# Altium footprint library LHAC-4XDSP2XV7-VP5_0226_3.PcbLib: 96 footprints (part 12 of 12)
Each footprint in its own frame and in the unit in brackets; x right, y up, seen from the top. Pads: shape width x height; smd on the part's side, far side on the other; paste and mask are expansions set on the pad; w line width, h text height; cw(c..) or ccw(c..) is an arc to the next point about the centre after c.
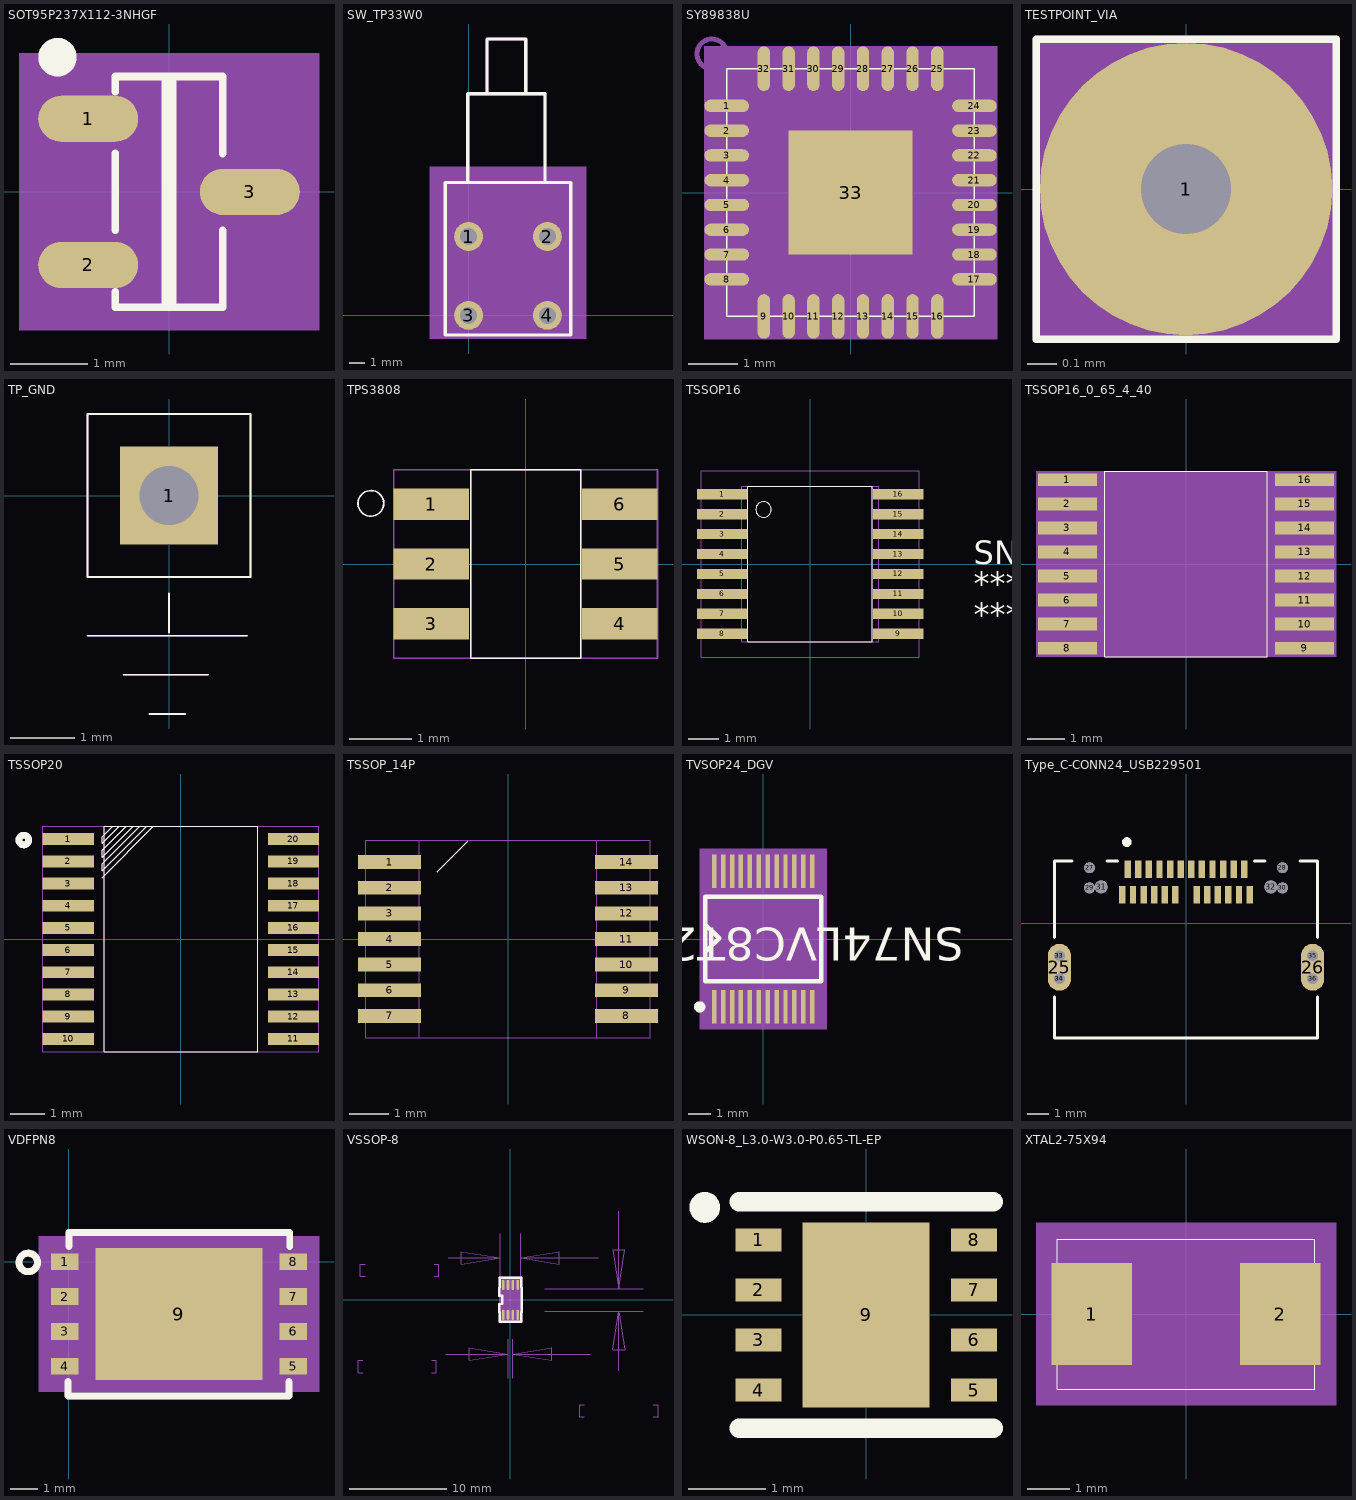
[diagram p11: the footprints below, top view; thin cyan lines are the x and y axes]

## SOT95P237X112-3NHGF [mil] "SOT95P237X112-3NHGF"
pads (3):
  oval 51.18x23.62 smd: 1(-41.34,37.4) 2(-41.34,-37.4) 3(41.34,0)
Top Overlay:
  circle w9.84: c-57.09,68.9 r4.92
  lines w3.94: -27.56,-51.18 -27.56,-59.06 27.56,-59.06 27.56,-19.69 ; -27.56,-19.69 -27.56,19.69 ; -27.56,51.18 -27.56,59.06 27.56,59.06 27.56,19.69
  lines w7.87: 0,-57.09 0,57.09
  text ".Designator" at 90,0 h25
Mechanical 5:
  circle w9.84: c-57.09,68.9 r4.92
  lines w3.94: -27.56,-51.18 -27.56,-59.06 27.56,-59.06 27.56,-19.69 ; -27.56,-19.69 -27.56,19.69 ; -27.56,51.18 -27.56,59.06 27.56,59.06 27.56,19.69
  lines w7.87: 0,-57.09 0,57.09
  text "Q3" at 89.99,0 h25
  text "L14P2/TO_0_SOT95P237X112-3NHGF_" at -310,29.53 h25
Mechanical 14:
  text "2" at -51.34,-37.4 h25
  text "1" at -51.34,37.4 h25
  text "3" at 31.34,0 h25
Mechanical 16:
  circle w1.97: c0,0 r13.78
  region: -76.77,-70.87 -76.77,70.87 76.77,70.87 76.77,-70.87
  pour cut-out: -76.77,-70.87 -76.77,70.87 76.77,70.87 76.77,-70.87
  lines w1.97: -19.69,0 19.69,0 ; 0,-19.69 0,19.69
  lines w3.94: -25.59,18.11 13.78,57.48 ; -25.59,22.05 9.84,57.48 ; -25.59,25.98 5.91,57.48 ; -25.59,29.92 1.97,57.48 ; -25.59,33.86 -1.97,57.48 ; -25.59,37.8 -5.91,57.48 ; -25.59,41.73 -9.84,57.48 ; -25.59,45.67 -13.78,57.48 ; -25.59,49.61 -17.72,57.48 ; -25.59,53.54 -21.65,57.48 ; -25.59,-57.48 25.59,-57.48 25.59,57.48 -25.59,57.48 -25.59,-57.48
3D body: height 150, standoff 0, extent -76.77,-70.87 76.77,70.87

## SW_TP33W0 [mil] "SW_TP33W0"
pads (4):
  round 73 hole 43: 1(0,200) 2(200,200) 3(0,0) 4(200,0)
Top Overlay:
  lines w8: -2,337 -2,562 194,562 194,337 ; 47,562 47,701 145,701 145,562 ; -59,-50 -59,337 259,337 259,-50 -59,-50
Mechanical 5:
  lines w8: -2,337 -2,562 194,562 194,337 ; 47,562 47,701 145,701 145,562 ; -59,-50 259,-50 259,337 -59,337 -59,-50
  text "SW1" at 280.05,132.35 h25
Mechanical 14:
  text "4" at 200,10 h25
  text "3" at 0,10 h25
  text "2" at 200,210 h25
  text "1" at 0,210 h25
Mechanical 16:
  region: -99,-60 299,-60 299,377 -99,377
  lines w1: -59,0 -59,337 259,337 259,0 -59,0 ; -2,337 -2,562 194,562 194,337 -2,337 ; 47,562 47,701 145,701 145,562 47,562
Mechanical 17:
  text ".Designator" at 59.84,148.13 h31.1
  text "TP33W003050" at -55,-100 h31.1
3D body: height 150, standoff 0, extent -99,-60 299,377

## SY89838U [mil] "SY89838U"
pads (33):
  oval 35.43x9.84 smd: 1(-98.42,68.9) 2(-98.42,49.21) 3(-98.42,29.53) 4(-98.42,9.84) 5(-98.42,-9.84) 6(-98.42,-29.53) 7(-98.42,-49.21) 8(-98.42,-68.9) 17(98.42,-68.9) 18(98.42,-49.21) 19(98.42,-29.53) 20(98.42,-9.84) 21(98.42,9.84) 22(98.42,29.53) 23(98.42,49.21) 24(98.42,68.9)
  oval 9.84x35.43 smd: 9(-68.9,-98.42) 10(-49.21,-98.42) 11(-29.53,-98.42) 12(-9.84,-98.42) 13(9.84,-98.42) 14(29.53,-98.42) 15(49.21,-98.42) 16(68.9,-98.42) 25(68.9,98.42) 26(49.21,98.42) 27(29.53,98.42) 28(9.84,98.42) 29(-9.84,98.42) 30(-29.53,98.42) 31(-49.21,98.42) 32(-68.9,98.42)
  rect 98.42x98.42 smd: 33(0,0)
Top Overlay:
  lines w1: -98.42,-98.42 98.42,-98.42 98.42,98.42 -98.42,98.42 -98.42,-98.42
Mechanical 5:
  lines w1: -98.42,-73.82 -98.42,-98.42 -73.82,-98.42 ; -98.42,-63.98 -98.42,-54.12 ; -98.42,-44.3 -98.42,-34.44 ; -98.42,-24.62 -98.42,-14.76 ; -98.42,-4.92 -98.42,4.92 ; -98.42,14.76 -98.42,24.62 ; -98.42,34.44 -98.42,44.3 ; -98.42,54.12 -98.42,63.98 ; -98.42,73.82 -98.42,98.42 -73.82,98.42 ; -63.98,-98.42 -54.12,-98.42 ; -63.98,98.42 -54.12,98.42 ; -44.3,-98.42 -34.44,-98.42 ; -44.3,98.42 -34.44,98.42 ; -24.62,-98.42 -14.76,-98.42 ; -24.62,98.42 -14.76,98.42 ; -4.92,-98.42 4.92,-98.42 ; -4.92,98.42 4.92,98.42 ; 14.76,-98.42 24.62,-98.42 ; 14.76,98.42 24.62,98.42 ; 34.44,-98.42 44.3,-98.42 ; 34.44,98.42 44.3,98.42 ; 54.12,-98.42 63.98,-98.42 ; 54.12,98.42 63.98,98.42 ; 73.82,-98.42 98.42,-98.42 98.42,-73.82 ; 73.82,98.42 98.42,98.42 98.42,73.82 ; 98.42,-63.98 98.42,-54.12 ; 98.42,-44.3 98.42,-34.44 ; 98.42,-24.62 98.42,-14.76 ; 98.42,-4.92 98.42,4.92 ; 98.42,14.76 98.42,24.62 ; 98.42,34.44 98.42,44.3 ; 98.42,54.12 98.42,63.98
  text "U73" at -7.49,-122.5 h25
Mechanical 14:
  text "23" at 114.42,49.21 h20
  text "24" at 114.42,68.9 h20
  text "16" at 84.9,-98.42 h20
  text "15" at 65.21,-98.42 h20
  text "6" at -90.42,-29.53 h20
  text "8" at -90.42,-68.9 h20
  text "4" at -90.42,9.84 h20
  text "5" at -90.42,-9.84 h20
  text "2" at -90.42,49.21 h20
  text "7" at -90.42,-49.21 h20
  text "14" at 45.53,-98.42 h20
  text "11" at -13.53,-98.42 h20
  text "12" at 6.16,-98.42 h20
  text "13" at 25.84,-98.42 h20
  text "3" at -90.42,29.53 h20
  text "1" at -90.42,68.9 h20
  text "26" at 65.21,98.42 h20
  text "31" at -33.21,98.42 h20
  text "25" at 84.9,98.42 h20
  text "10" at -33.21,-98.42 h20
  text "18" at 114.42,-49.21 h20
  text "17" at 114.42,-68.9 h20
  text "22" at 114.42,29.53 h20
  text "19" at 114.42,-29.53 h20
  text "32" at -52.9,98.42 h20
  text "9" at -60.9,-98.42 h20
  text "29" at 6.16,98.42 h20
  text "30" at -13.53,98.42 h20
  text "27" at 45.53,98.42 h20
  text "28" at 25.84,98.42 h20
  text "21" at 114.42,9.84 h20
  text "20" at 114.42,-9.84 h20
  text "33" at 32,0 h20
Mechanical 16:
  circle w3.94: c-110.24,110.24 r11.81
  pour cut-out: -116.34,-116.34 116.34,-116.34 116.34,116.34 -116.34,116.34
  region: -116.34,-116.34 116.34,-116.34 116.34,116.34 -116.34,116.34
  lines w1: -98.42,-98.42 98.42,-98.42 98.42,98.42 -98.42,98.42 -98.42,-98.42
Mechanical 17:
  text ".Designator" at 60.01,-16.67 h50
3D body: height 150, standoff 0, extent -116.34,-116.34 116.34,116.34

## TESTPOINT_VIA [mil] "TESTPOINT_VIA"
pads (1):
  round 39 / inner round 20 / far side round 39 hole 12: 1(0,0)
Top Overlay:
  lines w1: -20,-20 -20,20 20,20 20,-20 -20,-20
Mechanical 5:
  lines w1: -20,-20 -20,20 20,20 20,-20 -20,-20
  text "TP38" at -117.19,97.15 h25
Mechanical 14:
  text "1" at 0,8 h20
Mechanical 16:
  region: -20,-20 20,-20 20,20 -20,20
  pour cut-out: -20,-20 20,-20 20,20 -20,20
  lines w1: -20,-20 -20,20 20,20 20,-20 -20,-20
Mechanical 17:
  text ".Designator" at 0,40 h25
3D body: height 150, standoff 0, extent -20,-20 20,20

## TP_GND [mil] "TP_GND"
pads (1):
  rect 60x60 / inner rect 55x55 / far side rect 60x60 hole 36: 1(0,0)
Top Overlay:
  lines w1: -50,-86 48,-86 ; -28,-110 24,-110 ; -12,-134 10,-134 ; 0,-84 0,-60 ; -50,-50 -50,50 50,50 50,-50 -50,-50
  text ".Designator" at -45.01,57.5 h25
Bottom Overlay:
  lines w1: -50,-86 48,-86 ; -28,-110 24,-110 ; -12,-134 10,-134 ; 0,-84 0,-60 ; -50,-50 -50,50 50,50 50,-50 -50,-50
Mechanical 5:
  lines w1: -50,-86 48,-86 ; -28,-110 24,-110 ; -12,-134 10,-134 ; 0,-84 0,-60 ; -50,-50 -50,50 50,50 50,-50 -50,-50
  text "TP29" at -45.01,57.5 h25
Mechanical 14:
  text "1" at -4,0 h10
Mechanical 16:
  lines w1: -50,-50 -50,50 ; -50,-50 50,-50 ; -50,-50 -50,50 ; -50,-50 50,-50 ; -50,50 50,50 ; -50,50 50,50 ; 50,-50 50,50 ; 50,-50 50,50

## TPS3808 [mil] "TPS3808"
pads (6):
  rect 47.24x19.68 smd: 1(-59.06,37.4) 2(-59.06,0) 3(-59.06,-37.4) 4(59.06,-37.4) 5(59.06,0) 6(59.06,37.4)
Top Overlay:
  circle w1: c-97,38 r8.06
  lines w1: -34.45,-59.06 34.45,-59.06 34.45,59.06 -34.45,59.06 -34.45,-59.06
  text ".Designator" at -56.89,67.61 h25
Top Paste:
  pour cut-out: -83.03,46.53 -83.03,27.53 -36.03,27.53 -36.03,46.53
  pour cut-out: -83.03,9.53 -83.03,-9.47 -36.03,-9.47 -36.03,9.53
  pour cut-out: -82.03,-28.47 -82.03,-47.47 -35.03,-47.47 -35.03,-28.47
  pour cut-out: 34.97,-27.47 34.97,-46.47 81.97,-46.47 81.97,-27.47
  pour cut-out: 35.97,9.53 35.97,-9.47 82.97,-9.47 82.97,9.53
  pour cut-out: 35.97,46.53 35.97,27.53 82.97,27.53 82.97,46.53
Top Solder:
  pour cut-out: -83,47 -83,28 -36,28 -36,47
  pour cut-out: -83,10 -83,-10 -35,-10 -35,10
  pour cut-out: -83,-27 -83,-48 -35,-48 -35,-27
  pour cut-out: 35,-28 35,-47 83,-47 83,-28
  pour cut-out: 35,10 35,-10 83,-10 83,10
  pour cut-out: 35,47 35,28 83,28 83,47
Mechanical 5:
  lines w1: -105.06,38 ccw(c-97,38) -97,29.94 ccw(c-97,38) -88.94,38 ccw(c-97,38) -97,46.06 ccw(c-97,38) -105.06,38 ; -34.45,-59.06 34.45,-59.06 34.45,59.06 -34.45,59.06 -34.45,-59.06
  text "U112" at 54.78,160.95 h25
Mechanical 14:
  text "1" at -67.06,37.4 h20
  text "6" at 51.06,37.4 h20
  text "4" at 51.06,-37.4 h20
  text "3" at -67.06,-37.4 h20
  text "5" at 51.06,0 h20
  text "2" at -67.06,0 h20
Mechanical 16:
  lines w1: -82.68,-59.06 82.68,-59.06 ; -82.68,-59.06 -82.68,59.06 ; -82.68,-59.06 82.68,-59.06 ; -82.68,-59.06 -82.68,59.06 ; -82.68,59.06 82.68,59.06 ; -82.68,59.06 82.68,59.06 ; 82.68,-59.06 82.68,59.06 ; 82.68,-59.06 82.68,59.06 ; -34.45,-59.06 34.45,-59.06 34.45,59.06 -34.45,59.06 -34.45,-59.06

## TSSOP16 [mil] "TSSOP16"
pads (16):
  rect 65x13 smd: 1(-113,89.6) 2(-113,64) 3(-113,38.4) 4(-113,12.8) 5(-113,-12.8) 6(-113,-38.4) 7(-113,-64) 8(-113,-89.6) 9(113,-89.6) 10(113,-64) 11(113,-38.4) 12(113,-12.8) 13(113,12.8) 14(113,38.4) 15(113,64) 16(113,89.6)
Top Overlay:
  circle w1: c-60,70 r10
  lines w1: -80,-100 -80,100 80,100 80,-100 -80,-100
  text "SN74AVC4T245PW" at 210,0 h30
  text "***" at 210,-40 h30
  text "***" at 210,-80 h30
Mechanical 5:
  circle w1: c-60,70 r10
  lines w1: -80,-100 -80,100 80,100 80,-100 -80,-100
  text "***" at 245,-80 h30
  text "***" at 245,-5 h30
  text "SN74AVC4T245PW" at 210,0 h30
  text "141_TI_SN74AVC4T245PWR_2_TSSOP1" at 210,40 h30
  text "U57" at -22.51,117.5 h25
Mechanical 14:
  text "9" at 113,-89.6 h25
  text "15" at 113,64 h25
  text "14" at 113,38.4 h25
  text "8" at -133,-89.6 h25
  text "1" at -133,89.6 h25
  text "3" at -133,38.4 h25
  text "2" at -133,64 h25
  text "4" at -133,12.8 h25
  text "11" at 113,-38.4 h25
  text "5" at -133,-12.8 h25
  text "7" at -133,-64 h25
  text "6" at -133,-38.4 h25
  text "13" at 113,12.8 h25
  text "10" at 113,-64 h25
  text "12" at 113,-12.8 h25
  text "16" at 113,89.6 h25
Mechanical 16:
  circle w1: c-60,70 r10
  lines w1: -140,-120 -140,120 140,120 140,-120 -140,-120 ; -88,-100 -88,100 88,100 88,-100 -88,-100
Mechanical 17:
  text ".Designator" at -30,60 h30
  text "141_TI_SN74AVC4T245PWR_2_TSSOP1" at -30,20 h30
  text "SN74AVC4T245PW" at -30,-10 h30
  text "***" at -30,-50 h30
  text "***" at -30,-90 h30

## TSSOP16_0_65_4_40 [mm] "TSSOP16_0_65_4_40"
pads (16):
  rect 1.6x0.35 smd: 1(-3.2,2.275) 2(-3.2,1.625) 3(-3.2,0.975) 4(-3.2,0.325) 5(-3.2,-0.325) 6(-3.2,-0.975) 7(-3.2,-1.625) 8(-3.2,-2.275) 9(3.2,-2.275) 10(3.2,-1.625) 11(3.2,-0.975) 12(3.2,-0.325) 13(3.2,0.325) 14(3.2,0.975) 15(3.2,1.625) 16(3.2,2.275)
Top Overlay:
  lines w0.025: -2.2,-2.5 -2.2,2.5 2.2,2.5 2.2,-2.5 -2.2,-2.5
Mechanical 5:
  lines w0.025: -2.2,-2.5 -2.2,2.5 2.2,2.5 2.2,-2.5 -2.2,-2.5
  text "U29" at 4.255,1.334 h0.64
Mechanical 14:
  text "8" at -2.997,-2.275 h0.51
  text "7" at -2.997,-1.625 h0.51
  text "14" at 3.606,0.975 h0.51
  text "15" at 3.606,1.625 h0.51
  text "9" at 3.403,-2.275 h0.51
  text "16" at 3.606,2.275 h0.51
  text "13" at 3.606,0.325 h0.51
  text "11" at 3.606,-0.975 h0.51
  text "12" at 3.606,-0.325 h0.51
  text "1" at -2.997,2.275 h0.51
  text "3" at -2.997,0.975 h0.51
  text "2" at -2.997,1.625 h0.51
  text "6" at -2.997,-0.975 h0.51
  text "5" at -2.997,-0.325 h0.51
  text "4" at -2.997,0.325 h0.51
  text "10" at 3.606,-1.625 h0.51
Mechanical 16:
  region: -4.05,-2.5 4.05,-2.5 4.05,2.5 -4.05,2.5
  pour cut-out: -4.05,-2.5 4.05,-2.5 4.05,2.5 -4.05,2.5
  lines w0.025: -2.2,-2.5 -2.2,2.5 2.2,2.5 2.2,-2.5 -2.2,-2.5
Mechanical 17:
  text ".Designator" at 0.152,0 h0.13
3D body: height 3.81, standoff 0, extent -4.05,-2.5 4.05,2.5

## TSSOP20 [mm] "TSSOP20"
pads (20):
  rect 1.5x0.35 smd: 1(-3.3,2.925) 2(-3.3,2.275) 3(-3.3,1.625) 4(-3.3,0.975) 5(-3.3,0.325) 6(-3.3,-0.325) 7(-3.3,-0.975) 8(-3.3,-1.625) 9(-3.3,-2.275) 10(-3.3,-2.925) 11(3.3,-2.925) 12(3.3,-2.275) 13(3.3,-1.625) 14(3.3,-0.975) 15(3.3,-0.325) 16(3.3,0.325) 17(3.3,0.975) 18(3.3,1.625) 19(3.3,2.275) 20(3.3,2.925)
Top Overlay:
  circle w0.2: c-4.6,2.9 r0.141
  lines w0.025: -2.3,1.8 -0.8,3.3 -1,3.3 -2.3,2 -2.3,2.2 -1.2,3.3 -1.4,3.3 -2.3,2.4 -2.3,2.6 -1.6,3.3 -1.8,3.3 -2.3,2.8 -2.3,3 -2,3.3 ; -2.25,-3.3 -2.25,3.3 2.25,3.3 2.25,-3.3 -2.25,-3.3
  text ".Designator" at -4.635,-1.461 h0.64
Mechanical 5:
  circle w0.2: c-4.6,2.9 r0.141
  lines w0.025: -2.3,1.8 -0.8,3.3 -1,3.3 -2.3,2 -2.3,2.2 -1.2,3.3 -1.4,3.3 -2.3,2.4 -2.3,2.6 -1.6,3.3 -1.8,3.3 -2.3,2.8 -2.3,3 -2,3.3 ; -2.25,-3.3 -2.25,3.3 2.25,3.3 2.25,-3.3 -2.25,-3.3
  text "U58" at -4.635,-1.461 h0.64
Mechanical 14:
  text "10" at -3.706,-2.925 h0.51
  text "20" at 2.894,2.925 h0.51
  text "8" at -3.503,-1.625 h0.51
  text "18" at 2.894,1.625 h0.51
  text "15" at 2.894,-0.325 h0.51
  text "13" at 2.894,-1.625 h0.51
  text "17" at 2.894,0.975 h0.51
  text "19" at 2.894,2.275 h0.51
  text "1" at -3.503,2.925 h0.51
  text "12" at 2.894,-2.275 h0.51
  text "2" at -3.503,2.275 h0.51
  text "3" at -3.503,1.625 h0.51
  text "7" at -3.503,-0.975 h0.51
  text "9" at -3.503,-2.275 h0.51
  text "14" at 2.894,-0.975 h0.51
  text "16" at 2.894,0.325 h0.51
  text "11" at 2.894,-2.925 h0.51
  text "6" at -3.503,-0.325 h0.51
  text "4" at -3.503,0.975 h0.51
  text "5" at -3.503,0.325 h0.51
Mechanical 16:
  lines w0.025: -4.05,-3.3 -4.05,3.3 ; -4.05,-3.3 4.05,-3.3 ; -4.05,-3.3 -4.05,3.3 ; -4.05,-3.3 4.05,-3.3 ; -4.05,3.3 4.05,3.3 ; -4.05,3.3 4.05,3.3 ; 4.05,-3.3 4.05,3.3 ; 4.05,-3.3 4.05,3.3 ; -2.25,-3.3 -2.25,3.3 2.25,3.3 2.25,-3.3 -2.25,-3.3

## TSSOP_14P [mm] "TSSOP_14P"
pads (14):
  rect 1.6x0.35 smd: 1(-3,1.95) 2(-3,1.3) 3(-3,0.65) 4(-3,0) 5(-3,-0.65) 6(-3,-1.3) 7(-3,-1.95) 8(3,-1.95) 9(3,-1.3) 10(3,-0.65) 11(3,0) 12(3,0.65) 13(3,1.3) 14(3,1.95)
Top Overlay:
  lines w0.025: -1.792,1.708 -1.789,1.708 -1.016,2.481
Mechanical 5:
  lines w0.025: -1.792,1.708 -1.789,1.708 -1.016,2.481
  text "U9" at -0.381,-3.492 h0.64
Mechanical 14:
  text "14" at 2.594,1.95 h0.51
  text "5" at -3.203,-0.65 h0.51
  text "6" at -3.203,-1.3 h0.51
  text "3" at -3.203,0.65 h0.51
  text "8" at 2.797,-1.95 h0.51
  text "2" at -3.203,1.3 h0.51
  text "12" at 2.594,0.65 h0.51
  text "11" at 2.594,0 h0.51
  text "9" at 2.797,-1.3 h0.51
  text "7" at -3.203,-1.95 h0.51
  text "4" at -3.203,0 h0.51
  text "1" at -3.203,1.95 h0.51
  text "10" at 2.594,-0.65 h0.51
  text "13" at 2.594,1.3 h0.51
Mechanical 16:
  lines w0.025: -3.605,-2.5 3.605,-2.5 ; -3.605,-2.5 -3.605,2.5 ; -3.605,-2.5 3.605,-2.5 ; -3.605,-2.5 -3.605,2.5 ; -3.605,2.5 3.605,2.5 ; -3.605,2.5 3.605,2.5 ; 3.605,-2.5 3.605,2.5 ; 3.605,-2.5 3.605,2.5 ; -2.25,-2.5 2.25,-2.5 2.25,2.5 -2.25,2.5 -2.25,-2.5
Mechanical 17:
  text ".Designator" at -1.016,0 h1.27

## TVSOP24_DGV [mm] "TVSOP24_DGV"
pads (24):
  rect 0.2x1.5 smd: 1(-2.2,-3.05) 2(-1.8,-3.05) 3(-1.4,-3.05) 4(-1,-3.05) 5(-0.6,-3.05) 6(-0.2,-3.05) 7(0.2,-3.05) 8(0.6,-3.05) 9(1,-3.05) 10(1.4,-3.05) 11(1.8,-3.05) 12(2.2,-3.05) 13(2.2,3.05) 14(1.8,3.05) 15(1.4,3.05) 16(1,3.05) 17(0.6,3.05) 18(0.2,3.05) 19(-0.2,3.05) 20(-0.6,3.05) 21(-1,3.05) 22(-1.4,3.05) 23(-1.8,3.05) 24(-2.2,3.05)
Top Overlay:
  circle w0.25: c-2.85,-3.05 r0.125
  lines w0.2: -2.6,0.65 -2,0.05 ; -2.581,-0.565 -1.981,0.035 ; -2.6,-1.9 -2.6,1.9 2.6,1.9 2.6,-1.9 -2.6,-1.9
  text "SN74LVC8T245DGV" at 9.001,0.5 h1.5
Mechanical 5:
  circle w0.25: c-2.85,-3.05 r0.125
  lines w0.2: -2.6,0.65 -2,0.05 ; -2.581,-0.565 -1.981,0.035 ; -2.6,-1.9 -2.6,1.9 2.6,1.9 2.6,-1.9 -2.6,-1.9
  text "U47" at 0.762,-3.937 h0.64
  text "SN74LVC8T245DGV" at 9.001,0.5 h1.5
Mechanical 14:
  text "22" at -1.08,3.05 h0.4
  text "13" at 2.52,3.05 h0.4
  text "12" at 2.52,-3.05 h0.4
  text "11" at 2.12,-3.05 h0.4
  text "1" at -2.04,-3.05 h0.4
  text "3" at -1.24,-3.05 h0.4
  text "4" at -0.84,-3.05 h0.4
  text "24" at -1.88,3.05 h0.4
  text "23" at -1.48,3.05 h0.4
  text "2" at -1.64,-3.05 h0.4
  text "21" at -0.68,3.05 h0.4
  text "20" at -0.28,3.05 h0.4
  text "14" at 2.12,3.05 h0.4
  text "15" at 1.72,3.05 h0.4
  text "16" at 1.32,3.05 h0.4
  text "17" at 0.92,3.05 h0.4
  text "18" at 0.52,3.05 h0.4
  text "19" at 0.12,3.05 h0.4
  text "10" at 1.72,-3.05 h0.4
  text "9" at 1.16,-3.05 h0.4
  text "8" at 0.76,-3.05 h0.4
  text "7" at 0.36,-3.05 h0.4
  text "6" at -0.04,-3.05 h0.4
  text "5" at -0.44,-3.05 h0.4
Mechanical 16:
  circle w0.4: c-2.1,-1.75 r0.2
  region: -2.85,-4.05 2.85,-4.05 2.85,4.05 -2.85,4.05
  pour cut-out: -2.31,-3.3 -2.31,-2.25 -2.6,-2.25 -2.6,2.25 -2.31,2.25 -2.31,3.3 2.31,3.3 2.31,2.25 2.6,2.25 2.6,-2.25 2.31,-2.25 2.31,-3.3
  lines w0.2: -2.2,-2.6 -2.2,-2.25 ; -2.2,2.25 -2.2,2.6 ; -1.8,-2.6 -1.8,-2.25 ; -1.8,2.25 -1.8,2.6 ; -1.4,-2.6 -1.4,-2.25 ; -1.4,2.25 -1.4,2.6 ; -1,-2.6 -1,-2.25 ; -1,2.25 -1,2.6 ; -0.6,-2.6 -0.6,-2.25 ; -0.6,2.25 -0.6,2.6 ; -0.2,-2.6 -0.2,-2.25 ; -0.2,2.25 -0.2,2.6 ; 0.2,-2.6 0.2,-2.25 ; 0.2,2.25 0.2,2.6 ; 0.6,-2.6 0.6,-2.25 ; 0.6,2.25 0.6,2.6 ; 1,-2.6 1,-2.25 ; 1,2.25 1,2.6 ; 1.4,-2.6 1.4,-2.25 ; 1.4,2.25 1.4,2.6 ; 1.8,-2.6 1.8,-2.25 ; 1.8,2.25 1.8,2.6 ; 2.2,-2.6 2.2,-2.25 ; 2.2,2.25 2.2,2.6 ; -2.6,-2.25 -2.6,2.25 2.6,2.25 2.6,-2.25 -2.6,-2.25
  lines w0.22: -2.2,-3.2 -2.2,-2.6 ; -2.2,2.6 -2.2,3.2 ; -1.8,-3.2 -1.8,-2.6 ; -1.8,2.6 -1.8,3.2 ; -1.4,-3.2 -1.4,-2.6 ; -1.4,2.6 -1.4,3.2 ; -1,-3.2 -1,-2.6 ; -1,2.6 -1,3.2 ; -0.6,-3.2 -0.6,-2.6 ; -0.6,2.6 -0.6,3.2 ; -0.2,-3.2 -0.2,-2.6 ; -0.2,2.6 -0.2,3.2 ; 0.2,-3.2 0.2,-2.6 ; 0.2,2.6 0.2,3.2 ; 0.6,-3.2 0.6,-2.6 ; 0.6,2.6 0.6,3.2 ; 1,-3.2 1,-2.6 ; 1,2.6 1,3.2 ; 1.4,-3.2 1.4,-2.6 ; 1.4,2.6 1.4,3.2 ; 1.8,-3.2 1.8,-2.6 ; 1.8,2.6 1.8,3.2 ; 2.2,-3.2 2.2,-2.6 ; 2.2,2.6 2.2,3.2
Mechanical 17:
  text ".Designator" at 0.48,0.133 h0.4
  text "SN74LVC8T245DGV" at 2.4,-0.2 h0.4
  text "RichardLC" at 1.44,-0.2 h0.4
  text "partnum" at 1.12,-0.2 h0.4
3D body: height 3.81, standoff 0, extent -2.85,-4.05 2.85,4.05

## Type_C-CONN24_USB229501 [mil]
pads (38):
  oval 43x87 smd: 25(-235.04,-81.67) 26(235.04,-81.67)
  round 20 hole 20: 27(-179.13,103.17) 28(179.13,103.17) 29(-179.13,65.73) 30(179.13,65.73) 33(-235.04,-60.17) 33(-235.04,-60.17) 34(-235.04,-103.17) 34(-235.04,-103.17) 35(235.04,-60.17) 36(235.04,-103.17)
  round 24 hole 24: 31(-157.48,67.74) 32(157.48,67.74)
  rect 12x32 smd paste+0 mask+0: A1(-108.27,100.38) A2(-88.58,100.38) A3(-68.9,100.38) A4(-49.21,100.38) A5(-29.53,100.38) A6(-9.84,100.38) A7(9.84,100.38) A8(29.53,100.38) A9(49.21,100.38) A10(68.9,100.38) A11(88.58,100.38) A12(108.27,100.38) B1(118.11,53.13) B2(98.43,53.13) B3(78.74,53.13) B4(59.06,53.13) B5(39.37,53.13) B6(19.68,53.13) B7(-19.68,53.13) B8(-39.37,53.13) B9(-59.06,53.13) B10(-78.74,53.13) B11(-98.43,53.13) B12(-118.11,53.13)
Top Overlay:
  circle w10: c-110,150.85 r4
  lines w6: -244,-137.09 -244,-213.15 244,-213.15 244,-137.09 ; -244,-26.25 -244,115.85 -212.23,115.85 ; -146.03,115.85 -127.1,115.85 ; 127.1,115.85 146.03,115.85 ; 212.23,115.85 244,115.85 244,-26.25
Bottom Overlay:
  circle w10: c-110,150.85 r4
Mechanical 13:
  circle w5: c-110,150.85 r4

## VDFPN8 [mil] "VDFPN8"
pads (9):
  rect 40x24 smd: 1(-6,0) 2(-6,-50) 3(-6,-100) 4(-6,-150) 5(322,-150) 6(322,-100) 7(322,-50) 8(322,0)
  rect 240x189 smd: 9(158,-75)
Top Overlay:
  circle w10: c-58.3,-1 r13.3
  lines w10: -1,-172 -1,-193 316,-193 316,-183 316,-172 ; 0,22 0,33 0,42 317,42 317,22
Mechanical 5:
  lines w10: -1,-172 -1,-193 316,-193 316,-183 316,-172 ; 0,22 0,33 0,42 317,42 317,22 ; -71.6,-1 ccw(c-58.3,-1) -58.3,-14.3 ccw(c-58.3,-1) -45,-1 ccw(c-58.3,-1) -58.3,12.3 ccw(c-58.3,-1) -71.6,-1
  text "U214" at 163,-220 h25
Mechanical 14:
  text "9" at 168,-75 h25
  text "4" at 4,-150 h25
  text "8" at 332,0 h25
  text "1" at 4,0 h25
  text "5" at 332,-150 h25
  text "2" at 4,-50 h25
  text "3" at 4,-100 h25
  text "7" at 332,-50 h25
  text "6" at 332,-100 h25
Mechanical 16:
  region: -43,-186.5 -43,36.5 359,36.5 359,-186.5
3D body: height 150, standoff 0, extent -43,-186.5 359,36.5

## VSSOP-8 [mil] "VSSOP-8"
pads (8):
  oval 11x41 smd: 1(-29.53,-60.61) 2(-9.84,-60.61) 3(9.84,-60.61) 4(29.53,-60.61) 5(29.53,60.61) 6(9.84,60.61) 7(-9.84,60.61) 8(-29.53,60.61)
Top Overlay:
  lines w10: -46.34,-50.28 -46.34,-16.76 -32.93,-16.76 -32.93,16.76 -46.34,16.76 -46.34,50.28 -43.03,50.28 -43.03,89.11 43.03,89.11 43.03,50.28 46.34,50.28 46.34,-50.28 43.03,-50.28 43.03,-89.11 -43.03,-89.11 -43.03,-50.28 -46.34,-50.28
Mechanical 5:
  lines w10: -46.34,-50.28 -43.03,-50.28 -43.03,-89.11 43.03,-89.11 43.03,-50.28 46.34,-50.28 46.34,50.28 43.03,50.28 43.03,89.11 -43.03,89.11 -43.03,50.28 -46.34,50.28 -46.34,16.76 -32.93,16.76 -32.93,-16.76 -46.34,-16.76 -46.34,-50.28
  text "U85" at -94.54,-38.68 h25
Mechanical 13:
  lines w1: -600,-295 -619,-295 -619,-245 -600,-245 ; -590,95 -609,95 -609,145 -590,145 ; -320,-295 -301,-295 -301,-245 -320,-245 ; -310,95 -291,95 -291,145 -310,145 ; -263.5,-220 -9.84,-220 ; -253.5,170 -41.34,170 ; -41.34,53.15 -41.34,268.43 ; -9.84,-318.43 -9.84,-159.04 ; 9.84,-318.43 9.84,-159.04 ; 41.34,53.15 41.34,268.43 ; 139.76,-45.28 538.43,-45.28 ; 139.76,45.28 538.43,45.28 ; 300,-475 281,-475 281,-425 300,-425 ; 324.8,-220 9.84,-220 ; 356.3,170 41.34,170 ; 440,-287.5 440,-45.28 ; 440,360.24 440,45.28 ; 580,-475 599,-475 599,-425 580,-425 ; -41.34,170 -198.82,145.39 -198.82,194.61 -41.34,170 ; -9.84,-220 -167.32,-244.61 -167.32,-195.39 -9.84,-220 ; 9.84,-220 167.32,-195.39 167.32,-244.61 9.84,-220 ; 41.34,170 198.82,194.61 198.82,145.39 41.34,170 ; 440,-45.28 464.61,-202.76 415.39,-202.76 440,-45.28 ; 440,45.28 415.39,202.76 464.61,202.76 440,45.28
  text "90.55" at 319,-475 h36
  text "2.3" at 370,-375 h36
  text "82.68" at -571,95 h36
  text "2.1" at -520,195 h36
  text "19.69" at -581,-295 h36
  text "0.5" at -530,-195 h36
Mechanical 14:
  text "2" at 1.36,-60.61 h28
  text "7" at 1.36,60.61 h28
  text "8" at -18.33,60.61 h28
  text "6" at 21.04,60.61 h28
  text "3" at 21.04,-60.61 h28
  text "5" at 40.73,60.61 h28
  text "4" at 40.73,-60.61 h28
  text "1" at -18.33,-60.61 h28
Mechanical 16:
  pour cut-out: 43.03,89.11 43.03,50.28 46.34,50.28 46.34,-50.28 43.03,-50.28 43.03,-89.11 -43.03,-89.11 -43.03,-50.28 -46.34,-50.28 -46.34,50.28 -43.03,50.28 -43.03,89.11
  region: -35.04,-61.03 -35.04,-45.28 -41.34,-45.28 -41.34,45.28 -35.04,45.28 -35.04,61.03 -24.02,61.03 -24.02,45.28 -15.35,45.28 -15.35,61.03 -4.33,61.03 -4.33,45.28 4.33,45.28 4.33,61.03 15.35,61.03 15.35,45.28 24.02,45.28 24.02,61.03 35.04,61.03 35.04,45.28 41.34,45.28 41.34,-45.28 35.04,-45.28 35.04,-61.03 24.02,-61.03 24.02,-45.28 15.35,-45.28 15.35,-61.03 4.33,-61.03 4.33,-45.28 -4.33,-45.28 -4.33,-61.03 -15.35,-61.03 -15.35,-45.28 -24.02,-45.28 -24.02,-61.03
  lines w1: -41.34,-45.28 -41.34,45.28 41.34,45.28 41.34,-45.28 -41.34,-45.28 ; -35.04,-61.03 -35.04,-50.03 -24.02,-50.03 -24.02,-61.03 -35.04,-61.03 ; -35.04,50.03 -35.04,61.03 -24.02,61.03 -24.02,50.03 -35.04,50.03 ; -15.35,-61.03 -15.35,-50.03 -4.33,-50.03 -4.33,-61.03 -15.35,-61.03 ; -15.35,50.03 -15.35,61.03 -4.33,61.03 -4.33,50.03 -15.35,50.03 ; 4.33,-61.03 4.33,-50.03 15.35,-50.03 15.35,-61.03 4.33,-61.03 ; 4.33,50.03 4.33,61.03 15.35,61.03 15.35,50.03 4.33,50.03 ; 24.02,-61.03 24.02,-50.03 35.04,-50.03 35.04,-61.03 24.02,-61.03 ; 24.02,50.03 24.02,61.03 35.04,61.03 35.04,50.03 24.02,50.03
Mechanical 17:
  text ".Designator" at 43.2,0 h36
3D body: height 150, standoff 0, extent -41.34,-61.03 41.34,61.03

## WSON-8_L3.0-W3.0-P0.65-TL-EP [mm]
pads (9):
  rect 0.6x0.3 smd: 1(-1.4,0.975) 2(-1.4,0.325) 3(-1.4,-0.325) 4(-1.4,-0.975) 5(1.4,-0.975) 6(1.4,-0.325) 7(1.4,0.325) 8(1.4,0.975)
  rect 1.65x2.4 smd: 9(0,0)
Top Overlay:
  lines w0.2: -1.999,1.397 cw(c-2.099,1.398) -1.999,1.4
  lines w0.254: -1.651,-1.473 1.649,-1.473 ; -1.649,1.473 1.651,1.473

## XTAL2-75X94 [mil] "XTAL2-75X94"
pads (2):
  rect 75x95 smd: 1(-88,0) 2(88,0)
Top Overlay:
  lines w1: -120,-70 120,-70 120,70 -120,70 -120,-70
Mechanical 5:
  lines w1: -120,-47.5 -120,-70 120,-70 120,-47.5 ; -120,47.5 -120,70 120,70 120,47.5
  text "Y2" at -39.79,147.68 h25
Mechanical 14:
  text "1" at -88,16 h40
  text "2" at 88,16 h40
Mechanical 16:
  region: -140,-85 -140,85 140,85 140,-85
  lines w1: -120,-70 120,-70 120,70 -120,70 -120,-70
Mechanical 17:
  text ".Designator" at -40,-11.67 h35
3D body: height 150, standoff 0, extent -140,-85 140,85